# Altium footprint library Connector.PcbLib: 536 footprints (part 29 of 34)
Each footprint in its own frame and in the unit in brackets; x right, y up, seen from the top. Pads: shape width x height; smd on the part's side, far side on the other; paste and mask are expansions set on the pad; w line width, h text height; cw(c..) or ccw(c..) is an arc to the next point about the centre after c.
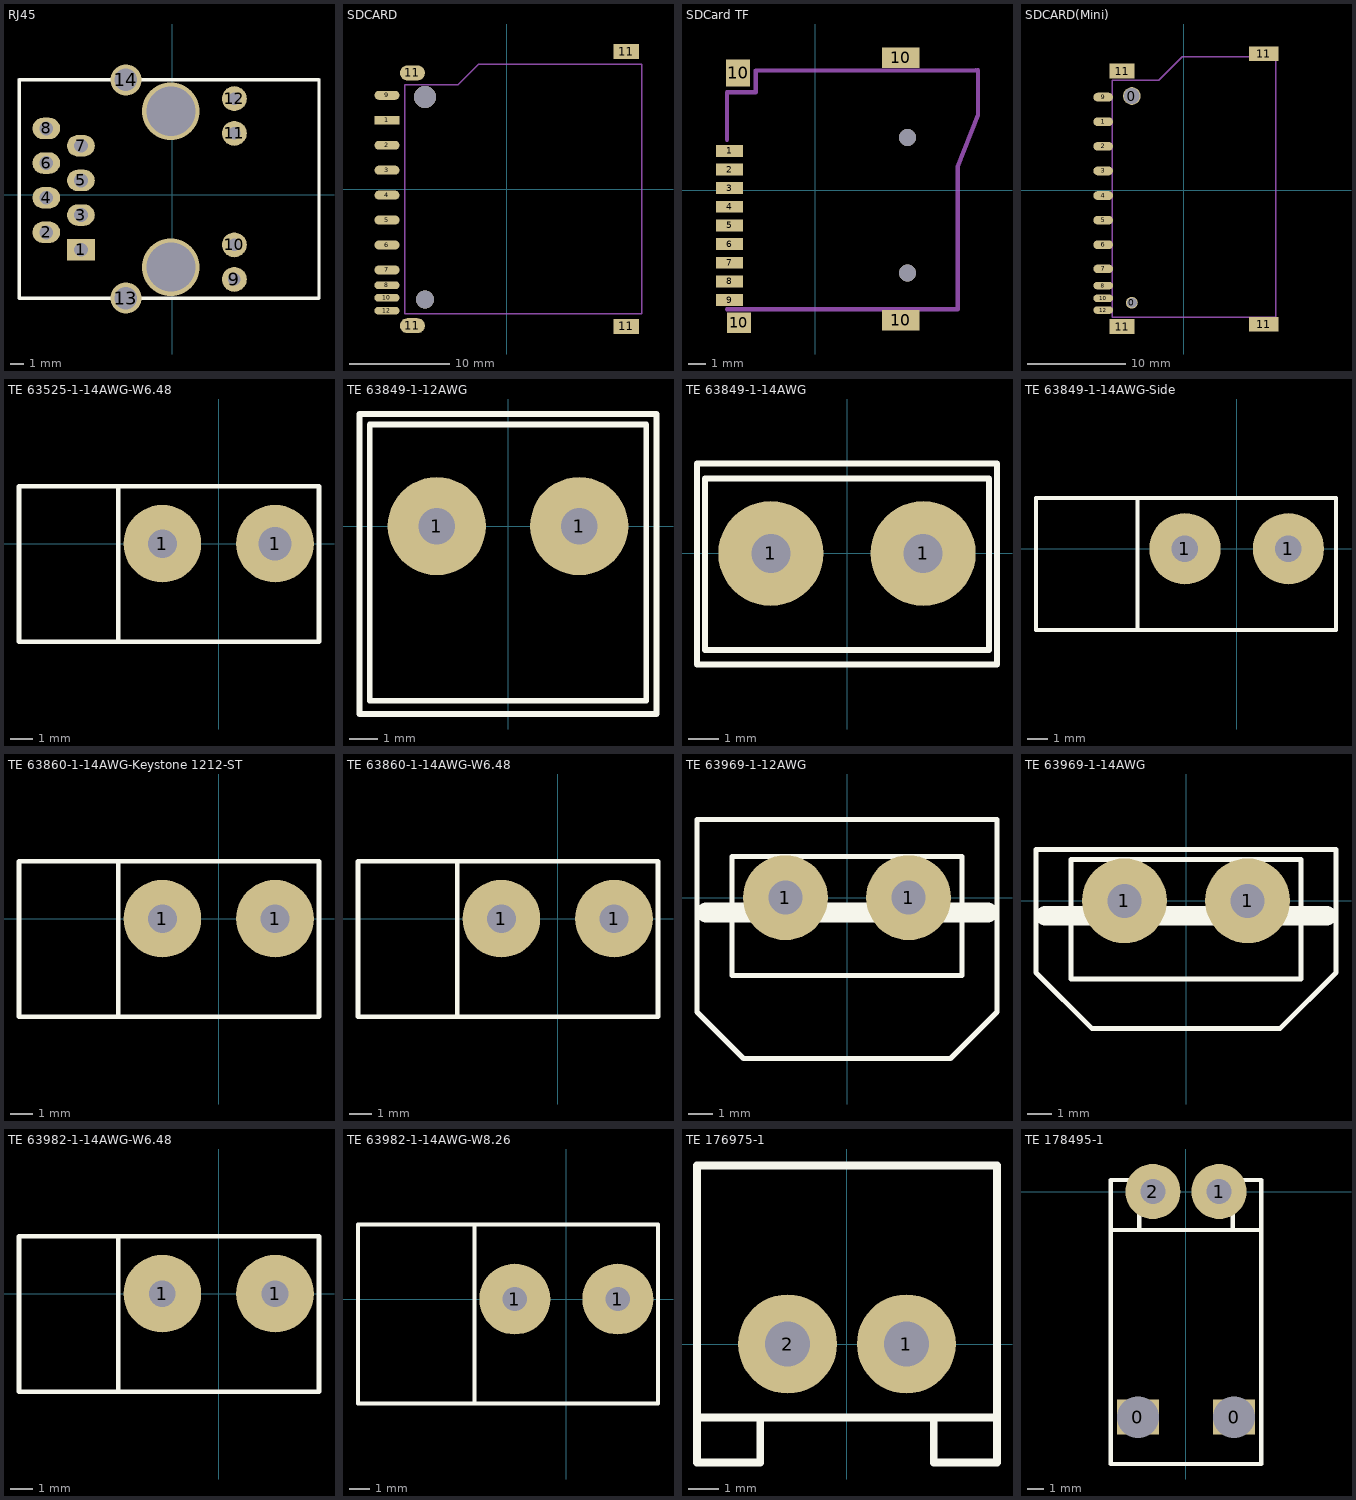
[diagram p28: the footprints below, top view; thin cyan lines are the x and y axes]

## RJ45 [mil]
pads (14):
  rect 80x62 hole 40: 1(-263.03,-158.23)
  oval 80x62 hole 40: 2(-363.03,-108.23) 3(-263.03,-58.23) 4(-363.03,-8.23) 5(-263.03,41.77) 6(-363.03,91.77) 7(-263.03,141.77) 8(-363.03,191.77)
  round 72 hole 36: 9(179.88,-243.86) 10(179.88,-144.23) 11(179.88,177.64) 12(179.88,277.77)
  round 90 hole 65: 13(-133.11,-297.99) 14(-133.11,331.93)
via -3.19,241.38 diameter 166 hole 142
via -3.19,-208.43 diameter 166 hole 142
Top Overlay:
  lines w10: -441.77,-298.23 -441.54,-297.99 ; -441.77,331.77 -441.61,331.93 ; -441.61,331.93 -441.61,-297.91 -441.54,-297.99 ; -441.61,331.93 -133.11,331.93 424.21,331.93 424.37,331.77 424.37,-298.23 424.13,-297.99 -133.11,-297.99 -441.54,-297.99
3D body "RJ45_8_LED.stp": height 97.24, standoff -633.6, extent -435.85,-344.76 423.99,376.76

## SDCARD [mil] "大号SDHC卡"
height 10
pads (15):
  rect 98.42x35 smd: 1(-470,270)
  oval 98.43x35 smd: 2(-470,172) 3(-470,74) 4(-470,-24) 5(-470,-122) 6(-470,-220) 7(-470,-318) 9(-470,368)
  oval 98.42x30 smd: 8(-470,-378) 10(-470,-427) 12(-470,-478)
  oval 98.42x59.05 smd: 11(-370,-537.09) 11(-370,456.1)
  rect 98.42x59.05 smd: 11(470,-540) 11(470,540)
via -320,-433.9 diameter 70.87 hole 70.87
via -320,361.1 diameter 86.61 hole 86.61
Mechanical 15:
  lines w6: -390,410 -190,410 -110,490 430,490 ; -250,410 -400,410 -400,-490 430,-490 ; 310,490 530,490 530,-490 410,-490
3D body "SD Card _SMD.STEP": height 133.86, standoff -19.69, extent -448,-548.59 585.47,552.79

## SDCard TF [mm] "小号TF卡"
pads (13):
  rect 1.6x0.7 smd: 1(-5.05,2.325) 2(-5.05,1.225) 3(-5.05,0.125) 4(-5.05,-0.975) 5(-5.05,-2.075) 6(-5.05,-3.175) 7(-5.05,-4.275) 8(-5.05,-5.375) 9(-5.05,-6.475)
  rect 1.4x1.6 smd: 10(-4.55,6.925)
  rect 1.4x1.2 smd: 10(-4.5,-7.825)
  rect 2.2x1.2 smd: 10(5.05,-7.675) 10(5.05,7.825)
via 5.45,3.125 diameter 1 hole 1
via 5.45,-4.875 diameter 1 hole 1
Mechanical 15:
  lines w0.254: -5.2,-7.025 8.403,-7.025 8.403,1.375 9.6,4.445 9.6,7.081 ; -5.2,2.975 -5.2,5.775 -3.5,5.775 -3.5,7.066 9.47,7.081
3D body "TF-micro-sd-card.STEP": height 2.2, standoff -0.5, extent -5.855,-7.973 11.345,8.127

## SDCARD(Mini) [mm] "小卡套SD卡"
height 0.254
pads (17):
  round 1.2 hole 1: 0(-5.25,-11.439)
  round 1.8 hole 1.6: 0(-5.25,9.567)
  oval 2x0.889 smd: 1(-8.161,6.955) 2(-8.161,4.455) 3(-8.161,1.955) 4(-8.161,-0.545) 5(-8.161,-3.045) 6(-8.161,-5.545) 7(-8.158,-7.992) 9(-8.161,9.455)
  oval 2x0.762 smd: 8(-8.158,-9.694) 10(-8.158,-10.989) 12(-8.158,-12.183)
  rect 2.5x1.5 smd: 11(-6.249,-13.86) 11(-6.249,12.097)
  rect 3x1.5 smd: 11(8.161,-13.623) 11(8.161,13.86)
Mechanical 15:
  lines w0.152: -7.223,-12.921 9.351,-12.921 ; -7.223,-12.894 -7.223,11.155 ; -7.222,11.157 -2.531,11.157 -0.109,13.579 9.331,13.579 ; 9.351,-12.894 9.351,13.579
3D body "SD_MINI.stp": height 2.85, standoff -0.7, extent -8.798,-14.339 9.652,14.461

## TE 63525-1-14AWG-W6.48 [mm]
pads (2):
  round 3.5 hole 1.3: 1(-2.54,0)
  round 3.5 hole 1.5: 1(2.54,0)
Top Overlay:
  lines w0.203: -4.521,-4.42 -4.521,2.591 ; -9.004,-4.42 -9.004,2.591 4.521,2.591 4.521,-4.42 -9.004,-4.42
3D body "c-63525-1-t-3d.stp": height 9.2, standoff -3.17, extent -3.505,-0.4 3.607,0.4
3D body "c-3-520340-2-h-3d.stp": height 18.07, standoff 2, extent -8.953,-4.14 4.127,2.337

## TE 63849-1-12AWG [mm]
pads (2):
  round 3.5 hole 1.3: 1(-2.54,0) 1(2.54,0)
Top Overlay:
  lines w0.203: -5.3,-6.7 5.3,-6.7 5.3,4 -5.3,4 -5.3,-6.7 ; -4.928,-6.228 4.935,-6.228 4.935,3.627 -4.928,3.627 -4.928,-6.228
3D body "c-4-520447-2-k-3d.stp": height 25.76, standoff 2, extent -4.928,-6.228 4.928,3.627
3D body "c-63849-1-k-3d.stp": height 10.36, standoff -3.66, extent -3.962,-1.543 3.962,1.543

## TE 63849-1-14AWG [mm]
pads (2):
  round 3.5 hole 1.3: 1(-2.54,0) 1(2.54,0)
Top Overlay:
  lines w0.203: 4.737,-3.216 -4.737,-3.216 -4.737,2.502 4.737,2.502 4.737,-3.213 ; -5,-3.7 5,-3.7 5,3 -5,3 -5,-3.7
3D body "3-0520116-2.stp": height 23.52, standoff 1.8, extent -4.737,-3.213 4.737,2.502
3D body "c-63849-1-k-3d.stp": height 10.36, standoff -3.66, extent -3.962,-1.543 3.962,1.543

## TE 63849-1-14AWG-Side [mm]
pads (2):
  round 3.5 hole 1.3: 1(-2.54,0) 1(2.54,0)
Top Overlay:
  lines w0.203: -4.877,-3.988 -4.877,2.489 ; -9.855,-3.988 -9.855,2.489 4.877,2.489 4.877,-3.988 -9.855,-3.988
3D body "c-63849-1-k-3d.stp": height 10.36, standoff -3.66, extent -3.962,-1.543 3.962,1.543
3D body "c-3-520133-2-p-3d.stp": height 17.57, standoff 1.5, extent -9.855,-3.988 4.877,2.489

## TE 63860-1-14AWG-Keystone 1212-ST [mm]
pads (2):
  round 3.5 hole 1.3: 1(-2.54,0) 1(2.54,0)
Top Overlay:
  lines w0.203: -4.521,-4.42 -4.521,2.591 ; -9.004,-4.42 4.521,-4.42 4.521,2.591 -9.004,2.591 -9.004,-4.42
3D body "c-63860-1-r-3d.stp": height 8.95, standoff -3.5, extent -3.962,-1.549 3.962,1.55
3D body "c-3-520340-2-h-3d.stp": height 18.07, standoff 2, extent -9.004,-4.14 4.077,2.337

## TE 63860-1-14AWG-W6.48 [mm]
pads (2):
  round 3.5 hole 1.3: 1(-2.54,0) 1(2.54,0)
Top Overlay:
  lines w0.203: -4.521,-4.42 -4.521,2.591 ; -9.004,-4.42 4.521,-4.42 4.521,2.591 -9.004,2.591 -9.004,-4.42
3D body "c-3-520340-2-h-3d.stp": height 18.07, standoff 2, extent -9.004,-4.14 4.077,2.337
3D body "c-63860-1-r-3d.stp": height 8.95, standoff -3.5, extent -3.962,-1.549 3.962,1.55

## TE 63969-1-12AWG [mm]
pads (2):
  round 3.5 hole 1.4: 1(-2.54,0) 1(2.54,0)
Top Overlay:
  lines w0.203: 4.737,-3.216 -4.737,-3.216 -4.737,1.695 4.737,1.695 4.737,-3.213 ; -6.185,-4.712 -6.185,3.226 6.185,3.226 6.185,-4.712 4.267,-6.629 -4.267,-6.629 -6.185,-4.712
  lines w0.81: -5.8,-0.61 5.8,-0.61
3D body "c-0521098-42-b-3d.stp": height 23.76, standoff 0, extent -6.185,-6.629 6.185,3.226
3D body "c-63969-1-c-3d.stp": height 9.38, standoff -3.81, extent -3.747,-2.559 3.747,1.695

## TE 63969-1-14AWG [mm]
pads (2):
  round 3.5 hole 1.4: 1(-2.54,0) 1(2.54,0)
Top Overlay:
  lines w0.203: -6.179,-2.965 -3.886,-5.258 ; 4.737,-3.216 -4.737,-3.216 -4.737,1.695 4.737,1.695 4.737,-3.213 ; 6.179,-2.965 3.886,-5.258 ; -3.886,-5.258 3.886,-5.258 ; -3.886,-5.258 -6.185,-2.959 -6.185,2.108 6.185,2.108 6.185,-2.959 3.886,-5.258
  lines w0.81: -5.8,-0.61 5.8,-0.61
3D body "c-63969-1-c-3d.stp": height 9.38, standoff -3.81, extent -3.747,-2.559 3.747,1.695
3D body "c-3-520107-2-c-3d.stp": height 21.72, standoff 0, extent -6.185,-5.258 6.185,2.108

## TE 63982-1-14AWG-W6.48 [mm]
pads (2):
  round 3.5 hole 1.2: 1(-2.54,0) 1(2.54,0)
Top Overlay:
  lines w0.203: -4.521,-4.42 -4.521,2.591 ; -9.004,-4.42 -9.004,2.591 4.521,2.591 4.521,-4.42 -9.004,-4.42
3D body "c-0520338-32-h-3d.stp": height 18.24, standoff 2.17, extent -8.903,-4.14 4.178,2.337
3D body "c-63982-1-h-3d.stp": height 8.75, standoff -3.7, extent -3.962,-1.397 3.962,1.397

## TE 63982-1-14AWG-W8.26 [mm]
pads (2):
  round 3.5 hole 1.2: 1(-2.54,0) 1(2.54,0)
Top Overlay:
  lines w0.203: -4.521,-5.156 -4.521,3.683 ; -10.274,-5.156 -10.274,3.683 4.521,3.683 4.521,-5.156 -10.274,-5.156
3D body "c-63982-1-h-3d.stp": height 8.75, standoff -3.7, extent -3.962,-1.397 3.962,1.397
3D body "c-0520997-32-d-3d.stp": height 19.45, standoff 2.5, extent -10.274,-4.882 4.077,3.378

## TE 176975-1 [mm]
pads (2):
  round 3.3 hole 1.5: 1(1.98,0) 2(-1.98,0)
Top Overlay:
  lines w0.254: -5,-2.45 5,-2.45 ; -2.89,-2.45 -2.89,-3.95 -5,-3.95 -5,5.95 5,5.95 5,-3.95 2.89,-3.95 2.89,-2.45
3D body "1-176975-1-d-3d.stp": height 14.03, standoff -3.77, extent -4.53,-3.95 4.53,5.95

## TE 178495-1 [mm]
pads (4):
  rect 2.5x2.1 hole 2.5 square: 0(-2.88,-13.5) 0(2.88,-13.5)
  round 3.3 hole 1.5: 1(1.98,0) 2(-1.98,0)
Top Overlay:
  lines w0.254: -4.503,-2.304 4.503,-2.304 ; -2.803,-2.304 -2.803,0.696 -4.503,0.696 -4.503,-16.304 4.503,-16.304 ; 2.803,-2.304 2.803,0.696 4.503,0.696 4.503,-16.304
3D body "178495-9.stp": height 9.55, standoff -3.8, extent -4.53,-16.302 4.53,0.699